# Altium footprint library ICs.PcbLib: 191 footprints (part 11 of 12)
Each footprint in its own frame and in the unit in brackets; x right, y up, seen from the top. Pads: shape width x height; smd on the part's side, far side on the other; paste and mask are expansions set on the pad; w line width, h text height; cw(c..) or ccw(c..) is an arc to the next point about the centre after c.
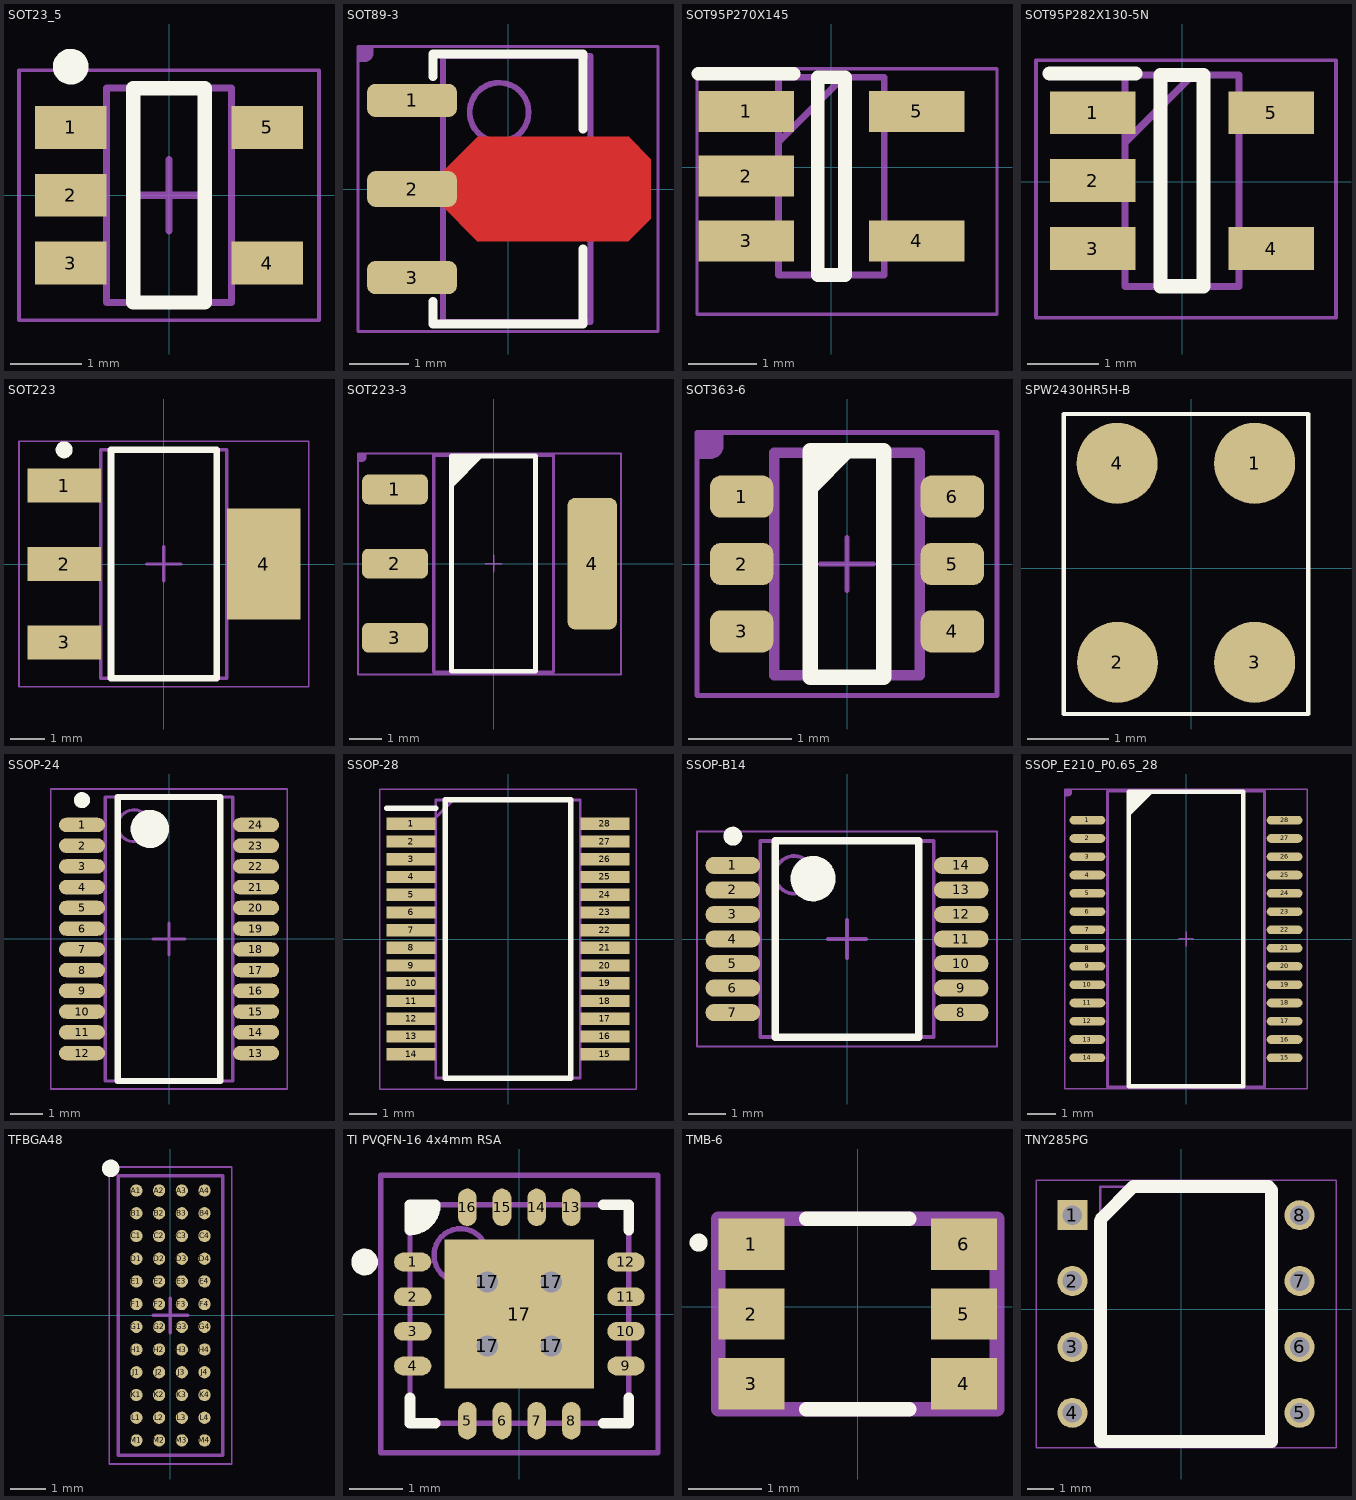
[diagram p10: the footprints below, top view; thin cyan lines are the x and y axes]

## SOT23_5 [mm]
height 1.45
pads (5):
  rect 1x0.6 smd: 1(-1.375,0.95) 2(-1.375,0) 3(-1.375,-0.95) 4(1.375,-0.95) 5(1.375,0.95)
Top Overlay:
  circle w0.25: c-1.375,1.8 r0.125
  lines w0.2: -0.5,-1.5 0.5,-1.5 0.5,1.5 -0.5,1.5 -0.5,-1.5
Mechanical 13:
  lines w0.1: -0.875,-1.5 -0.875,1.5 0.875,1.5 0.875,-1.5 -0.875,-1.5
Mechanical 15:
  lines w0.05: -2.1,-1.75 -2.1,1.75 2.1,1.75 2.1,-1.75 -2.1,-1.75
  lines w0.1: -0.5,0 0.5,0 ; 0,-0.5 0,0.5
3D body "SOT23.step": height 1.45, standoff 0, extent -1.5,-1.5 1.5,1.5

## SOT89-3 [mil]
height 59.06
pads (3):
  rrect50% 60x22 smd: 1(-64,59.06) 3(-64,-59.06)
  rrect50% 60x24 smd: 2(-64,0)
Top Layer:
  region: -45,10 -20,35 80,35 95,20 95,-20 80,-35 -20,-35 -45,-10
Top Overlay:
  lines w6: -50,-75 -50,-90 50,-90 50,-40 ; -50,75 -50,90 50,90 50,40
Mechanical 13:
  circle w3.94: c-5.91,51.18 r19.68
  lines w3.94: -13.78,0 25.59,0 ; 5.91,-19.69 5.91,19.68 ; -43.31,-88.58 55.12,-88.58 55.12,88.58 -43.31,88.58 -43.31,-88.58
Mechanical 14:
  region: -100,95 -90,95 -90,90 -90,89.01 -90.76,87.17 -92.17,85.76 -94.01,85 -95,85 -100,85
  lines w2: -100,-95 100,-95 100,95 -100,95 -100,-95
  text ".Designator" at -41,-25 h100
3D body "SOT89-150P410X150-3N.step": height 60.06, standoff 1, extent -82.67,-88.44 74.81,88.45

## SOT95P270X145 [mm]
pads (5):
  rect 1.4x0.6 smd: 1(-1.25,0.823) 2(-1.25,-0.127) 3(-1.25,-1.077) 4(1.25,-1.077) 5(1.25,0.823)
Top Overlay:
  lines w0.2: -1.95,1.373 -0.55,1.373 ; -0.2,-1.577 -0.2,1.323 0.2,1.323 0.2,-1.577 -0.2,-1.577
Mechanical 15:
  lines w0.1: -0.775,0.373 0.175,1.323 ; -0.775,-1.577 -0.775,1.323 0.775,1.323 0.775,-1.577 -0.775,-1.577
Mechanical 20:
  lines w0.05: -1.971,-2.156 -1.971,1.444 2.429,1.444 2.429,-2.156 -1.971,-2.156
3D body "MCP73831T-5ACI_OT.stp": height 1.45, standoff 0, extent -1.35,-1.577 1.35,1.323

## SOT95P282X130-5N [mm]
pads (5):
  rect 1.2x0.6 smd: 1(-1.255,0.965) 2(-1.255,0.015) 3(-1.255,-0.935) 4(1.245,-0.935) 5(1.245,0.965)
Top Overlay:
  lines w0.2: -1.855,1.515 -0.655,1.515 ; -0.305,-1.465 0.295,-1.465 0.295,1.495 -0.305,1.495 -0.305,-1.465
Mechanical 15:
  lines w0.1: -0.805,0.545 0.145,1.495 ; -0.805,-1.465 0.795,-1.465 0.795,1.495 -0.805,1.495 -0.805,-1.465
Mechanical 20:
  lines w0.05: -2.049,-1.902 2.151,-1.902 2.151,1.698 -2.049,1.698 -2.049,-1.902
3D body "AP2112K-3.3TRG1.stp": height 1.3, standoff 0, extent -1.418,-1.465 1.407,1.495

## SOT223 [mm] "SOT223, 4-Leads, Body 6.50x7.00mm (avg), Pitch 2.30mm, IPC Medium Density"
height 1.8
pads (4):
  rect 2.15x1 smd: 1(-2.925,2.3) 2(-2.925,0) 3(-2.925,-2.3)
  rect 2.15x3.25 smd: 4(2.925,0)
Top Overlay:
  circle w0.25: c-2.925,3.35 r0.125
  lines w0.2: -1.55,-3.35 -1.55,3.35 1.55,3.35 1.55,-3.35 -1.55,-3.35
Mechanical 13:
  lines w0.1: -1.85,-3.35 -1.85,3.35 1.85,3.35 1.85,-3.35 -1.85,-3.35
Mechanical 15:
  lines w0.05: -4.25,-3.6 -4.25,3.6 4.25,3.6 4.25,-3.6 -4.25,-3.6
  lines w0.1: -0.5,0 0.5,0 ; 0,-0.5 0,0.5
3D body "SOT223.step": height 1.8, standoff 0, extent -3.5,-3.35 3.5,3.35

## SOT223-3 [mil]
height 70.87
pads (4):
  rrect40% 80x36 smd: 1(-120,90.16) 2(-120,0) 3(-120,-90.16)
  rrect30% 60x160 smd: 4(120,0)
Top Overlay:
  region: -51.18,131 -11.81,131 -51.18,91.63
  lines w6: -51.18,-131 51.18,-131 51.18,131 -51.18,131 -51.18,-131
Mechanical 13:
  lines w2: -10,0 10,0 ; 0,-10 0,10
  lines w3.94: -72.83,-131.89 72.83,-131.89 72.83,131.89 -72.83,131.89 -72.83,-131.89
Mechanical 14:
  region: -165,134 -155,134 -155,129 -155,128.01 -155.76,126.17 -157.17,124.76 -159.01,124 -160,124 -165,124
  lines w2: -165,-135 155,-135 155,134 -165,134 -165,-135
  text ".Designator" at -41,-25 h100
3D body "SOT223-4.STEP": height 70.87, standoff 0, extent -143.69,-131.9 143.71,131.88

## SOT363-6 [mil]
height 43.31
pads (6):
  rrect50% 24x16 smd: 1(-40,25.59) 2(-40,0) 3(-40,-25.59) 4(40,-25.59) 5(40,0) 6(40,25.59)
Top Overlay:
  region: -14,43 0,43 -14,29
  lines w6: -14,29 0,43 ; -14,-43 -14,43 14,43 14,-43 -14,-43
Mechanical 13:
  lines w2: -10,0 10,0 ; 0,-10 0,10
  lines w4: -27.56,-42.32 -27.56,42.32 27.56,42.32 27.56,-42.32 -27.56,-42.32
Mechanical 14:
  region: -57,50 -47,50 -47,45 -47,44.01 -47.76,42.17 -49.17,40.76 -51.01,40 -52,40 -57,40
  lines w2: -57,-50 -57,50 57,50 57,-50 -57,-50
  text ".Designator" at -41,-25 h100
3D body "SW3dPS-SC70-6.STEP": height 36.73, standoff -0.67, extent -41.33,-39.37 41.35,39.37

## SPW2430HR5H-B [mm]
pads (4):
  round 1 smd: 1(0.786,1.295) 2(-0.911,-1.165) 3(0.786,-1.165) 4(-0.914,1.295)
Top Overlay:
  lines w0.05: -1.575,-1.803 1.448,-1.803 1.448,1.905 -1.575,1.905 -1.575,-1.803

## SSOP-24 [mm]
height 1.75
pads (24):
  oval 1.45x0.45 smd: 1(-2.725,3.575) 2(-2.725,2.925) 3(-2.725,2.275) 4(-2.725,1.625) 5(-2.725,0.975) 6(-2.725,0.325) 7(-2.725,-0.325) 8(-2.725,-0.975) 9(-2.725,-1.625) 10(-2.725,-2.275) 11(-2.725,-2.925) 12(-2.725,-3.575) 13(2.725,-3.575) 14(2.725,-2.925) 15(2.725,-2.275) 16(2.725,-1.625) 17(2.725,-0.975) 18(2.725,-0.325) 19(2.725,0.325) 20(2.725,0.975) 21(2.725,1.625) 22(2.725,2.275) 23(2.725,2.925) 24(2.725,3.575)
Top Overlay:
  circle w0.6: c-0.6,3.45 r0.3
  circle w0.25: c-2.725,4.35 r0.125
  lines w0.2: -1.6,-4.45 1.6,-4.45 1.6,4.45 -1.6,4.45 -1.6,-4.45
Mechanical 13:
  circle w0.1: c-1.1,3.55 r0.5
  lines w0.1: -2,-4.45 2,-4.45 2,4.45 -2,4.45 -2,-4.45
Mechanical 15:
  lines w0.05: -3.7,-4.7 3.7,-4.7 3.7,4.7 -3.7,4.7 -3.7,-4.7
  lines w0.1: -0.5,0 0.5,0 ; 0,-0.5 0,0.5
3D body "SSOP-24.step": height 1.75, standoff 0, extent -3,-4.45 3,4.45

## SSOP-28 [mm]
pads (28):
  rect 1.8x0.45 smd: 1(-3.55,4.225) 2(-3.55,3.575) 3(-3.55,2.925) 4(-3.55,2.275) 5(-3.55,1.625) 6(-3.55,0.975) 7(-3.55,0.325) 8(-3.55,-0.325) 9(-3.55,-0.975) 10(-3.55,-1.625) 11(-3.55,-2.275) 12(-3.55,-2.925) 13(-3.55,-3.575) 14(-3.55,-4.225) 15(3.55,-4.225) 16(3.55,-3.575) 17(3.55,-2.925) 18(3.55,-2.275) 19(3.55,-1.625) 20(3.55,-0.975) 21(3.55,-0.325) 22(3.55,0.325) 23(3.55,0.975) 24(3.55,1.625) 25(3.55,2.275) 26(3.55,2.925) 27(3.55,3.575) 28(3.55,4.225)
Top Overlay:
  lines w0.2: -4.45,4.8 -2.65,4.8 ; -2.3,-5.1 2.3,-5.1 2.3,5.1 -2.3,5.1 -2.3,-5.1
Mechanical 15:
  lines w0.1: -2.65,4.45 -2,5.1 ; -2.65,-5.1 2.65,-5.1 2.65,5.1 -2.65,5.1 -2.65,-5.1
Mechanical 20:
  lines w0.05: -4.7,-5.5 4.7,-5.5 4.7,5.5 -4.7,5.5 -4.7,-5.5
3D body "ENC28J60_SS.stp": height 2, standoff 0, extent -3.9,-5.1 3.9,5.1

## SSOP-B14 [mm] "SSOP, 14-Leads, Body 5.10x4.50mm, Pitch 0.65mm, IPC Medium Density"
height 1.15
pads (14):
  oval 1.45x0.45 smd: 1(-3.025,1.95) 2(-3.025,1.3) 3(-3.025,0.65) 4(-3.025,0) 5(-3.025,-0.65) 6(-3.025,-1.3) 7(-3.025,-1.95) 8(3.025,-1.95) 9(3.025,-1.3) 10(3.025,-0.65) 11(3.025,0) 12(3.025,0.65) 13(3.025,1.3) 14(3.025,1.95)
Top Overlay:
  circle w0.6: c-0.9,1.6 r0.3
  circle w0.25: c-3.025,2.725 r0.125
  lines w0.2: -1.9,-2.6 1.9,-2.6 1.9,2.6 -1.9,2.6 -1.9,-2.6
Mechanical 13:
  circle w0.1: c-1.4,1.7 r0.5
  lines w0.1: -2.3,-2.6 2.3,-2.6 2.3,2.6 -2.3,2.6 -2.3,-2.6
Mechanical 15:
  lines w0.05: -3.975,-2.85 3.975,-2.85 3.975,2.85 -3.975,2.85 -3.975,-2.85
  lines w0.1: -0.5,0 0.5,0 ; 0,-0.5 0,0.5
3D body "SSOP-B14.step": height 1.15, standoff 0, extent -3.275,-2.6 3.275,2.6

## SSOP_E210_P0.65_28 [mil]
height 78.74
pads (28):
  oval 50x12 smd: 1(-138,166.34) 2(-138,140.75) 3(-138,115.16) 4(-138,89.57) 5(-138,63.98) 6(-138,38.39) 7(-138,12.8) 8(-138,-12.8) 9(-138,-38.39) 10(-138,-63.98) 11(-138,-89.57) 12(-138,-115.16) 13(-138,-140.75) 14(-138,-166.34) 15(138,-166.34) 16(138,-140.75) 17(138,-115.16) 18(138,-89.57) 19(138,-63.98) 20(138,-38.39) 21(138,-12.8) 22(138,12.8) 23(138,38.39) 24(138,63.98) 25(138,89.57) 26(138,115.16) 27(138,140.75) 28(138,166.34)
Top Overlay:
  region: -80,206 -45,206 -80,171
  lines w6: -80,-206 -80,206 80,206 80,-206 -80,-206
Mechanical 13:
  lines w2: -10,0 10,0 ; 0,-10 0,10
  lines w4: -110,-207 -110,207 110,207 110,-207 -110,-207
Mechanical 14:
  region: -170,210 -160,210 -160,205 -160,204.01 -160.76,202.17 -162.17,200.76 -164.01,200 -165,200 -170,200
  lines w2: -170,-210 -170,210 170,210 170,-210 -170,-210
  text ".Designator" at -41,-25 h100
3D body "User Library-SSOP-28-1.STEP": height 84.65, standoff 0, extent -152.66,-203.34 152.68,203.35

## TFBGA48 [mm] "BGA, 48-Leads, Body 3.00x8.00mmx0.68mm, Pitch 0.65mm"
height 0.68
pads (48):
  round 0.35 smd: A1(-0.975,3.575) A2(-0.325,3.575) A3(0.325,3.575) A4(0.975,3.575) B1(-0.975,2.925) B2(-0.325,2.925) B3(0.325,2.925) B4(0.975,2.925) C1(-0.975,2.275) C2(-0.325,2.275) C3(0.325,2.275) C4(0.975,2.275) D1(-0.975,1.625) D2(-0.325,1.625) D3(0.325,1.625) D4(0.975,1.625) E1(-0.975,0.975) E2(-0.325,0.975) E3(0.325,0.975) E4(0.975,0.975) F1(-0.975,0.325) F2(-0.325,0.325) F3(0.325,0.325) F4(0.975,0.325) G1(-0.975,-0.325) G2(-0.325,-0.325) G3(0.325,-0.325) G4(0.975,-0.325) H1(-0.975,-0.975) H2(-0.325,-0.975) H3(0.325,-0.975) H4(0.975,-0.975) J1(-0.975,-1.625) J2(-0.325,-1.625) J3(0.325,-1.625) J4(0.975,-1.625) K1(-0.975,-2.275) K2(-0.325,-2.275) K3(0.325,-2.275) K4(0.975,-2.275) L1(-0.975,-2.925) L2(-0.325,-2.925) L3(0.325,-2.925) L4(0.975,-2.925) M1(-0.975,-3.575) M2(-0.325,-3.575) M3(0.325,-3.575) M4(0.975,-3.575)
Top Overlay:
  circle w0.25: c-1.71,4.21 r0.125
Assembly Top:
  lines w0.1: -1.5,-4 1.5,-4 1.5,4 -1.5,4 -1.5,-4
Courtyard Top:
  lines w0.05: -1.75,-4.25 1.75,-4.25 1.75,4.25 -1.75,4.25 -1.75,-4.25
  lines w0.1: -0.5,0 0.5,0 ; 0,-0.5 0,0.5
3D body "BGA48C65P4X12_300X800X68.step": height 0.68, standoff 0, extent -1.5,-4 1.5,4

## TI PVQFN-16 4x4mm RSA [mm] "QFN, 16-Leads, Body 4.1x4.1mm (max), Pitch 0.65mm, IPC Medium Density"
height 1
pads (21):
  oval 0.7x0.35 smd: 1(-2,0.975) 2(-2,0.325) 3(-2,-0.325) 4(-2,-0.975) 9(2,-0.975) 10(2,-0.325) 11(2,0.325) 12(2,0.975)
  oval 0.35x0.7 smd: 5(-0.975,-2) 6(-0.325,-2) 7(0.325,-2) 8(0.975,-2) 13(0.975,2) 14(0.325,2) 15(-0.325,2) 16(-0.975,2)
  round 0.8 hole 0.4 unplated: 17(-0.6,-0.6) 17(-0.6,0.6) 17(0.6,-0.6) 17(0.6,0.6)
  rect 2.8x2.8 smd: 17(0,0)
Top Overlay:
  circle w0.25: c-2.9,0.975 r0.125
  region: -2.05,2.05 -1.575,2.05 -1.575,1.854 -1.854,1.575 -2.05,1.575
  lines w0.2: -2.05,-1.575 -2.05,-2.05 -1.575,-2.05 ; 1.575,-2.05 2.05,-2.05 2.05,-1.575 ; 1.575,2.05 2.05,2.05 2.05,1.575 ; -2.05,1.575 ccw(c-2.05,2.05) -1.575,2.05 -2.05,2.05 -2.05,1.575
Mechanical 13:
  circle w0.1: c-1.1,1.1 r0.5
  lines w0.1: -2.05,-2.05 -2.05,2.05 2.05,2.05 2.05,-2.05 -2.05,-2.05
Mechanical 15:
  lines w0.1: -0.5,0 0.5,0 ; 0,-0.5 0,0.5 ; -2.6,-2.6 -2.6,2.6 2.6,2.6 2.6,-2.6 -2.6,-2.6
3D body: height 1, standoff 0.08, extent -2.05,-2.05 2.05,2.05

## TMB-6 [mm]
pads (6):
  rect 0.9x0.7 smd: 1(-1.45,0.848) 2(-1.45,-0.102) 3(-1.45,-1.052) 4(1.45,-1.052) 5(1.45,-0.102) 6(1.45,0.848)
Top Overlay:
  circle w0.2: c-2.167,0.871 r0.023
  lines w0.2: -0.7,-1.402 0.7,-1.402 ; -0.7,1.198 0.7,1.198
Mechanical 15:
  lines w0.2: -1.9,-1.402 1.9,-1.402 1.9,1.198 -1.9,1.198 -1.9,-1.402

## TNY285PG [mm]
pads (8):
  rect 1.16x1.16 / inner round 1.16 / far side rect 1.16x1.16 hole 0.76: 1(-4.204,3.632)
  round 1.16 hole 0.76: 2(-4.204,1.092) 3(-4.204,-1.448) 4(-4.204,-3.988) 5(4.56,-3.988) 6(4.56,-1.448) 7(4.56,1.092) 8(4.56,3.632)
Top Overlay:
  lines w0.2: -3.122,-5.093 3.478,-5.093
  lines w0.5: -3.122,3.404 -3.122,-5.093 3.478,-5.093 3.478,4.612 3.353,4.737 -1.852,4.737 -3.084,3.505
Mechanical 15:
  lines w0.1: -3.122,3.467 -1.852,4.737 ; -3.122,-5.093 3.478,-5.093 3.478,4.737 -3.122,4.737 -3.122,-5.093
Mechanical 20:
  lines w0.05: -5.607,-5.343 5.963,-5.343 5.963,4.987 -5.607,4.987 -5.607,-5.343
3D body "TNY285PG.stp": height 4.06, standoff -3.5, extent -4.243,-4.948 4.802,4.492